# Altium footprint library PartsDatabaseV16.1.PcbLib: 145 footprints (part 2 of 10)
Each footprint in its own frame and in the unit in brackets; x right, y up, seen from the top. Pads: shape width x height; smd on the part's side, far side on the other; paste and mask are expansions set on the pad; w line width, h text height; cw(c..) or ccw(c..) is an arc to the next point about the centre after c.
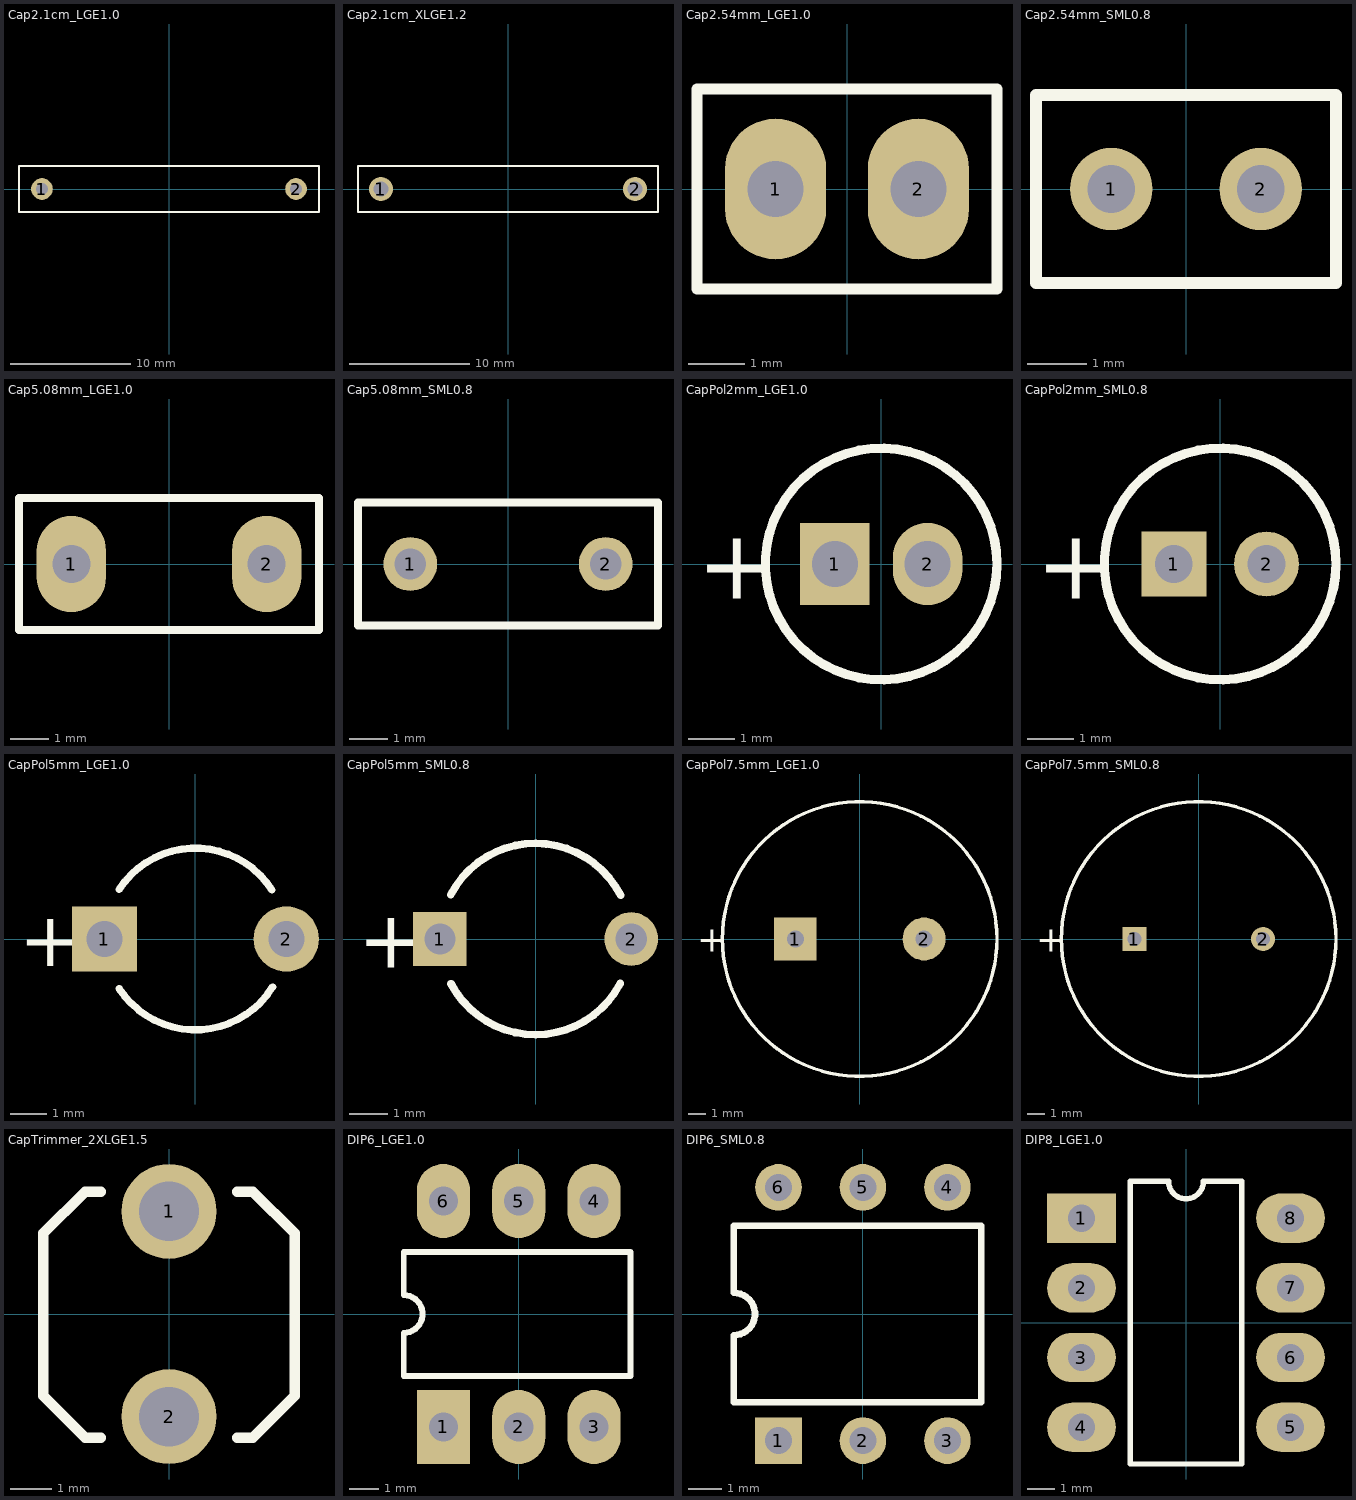
[diagram p1: the footprints below, top view; thin cyan lines are the x and y axes]

## Cap2.1cm_LGE1.0 [mm] "Radial Cap, Thru-Hole; 2 Leads"
height 6
pads (2):
  round 1.8 hole 0.991: 1(-10.541,0) 2(10.541,0)
Top Overlay:
  lines w0.2: -12.446,-1.905 -12.446,1.905 12.446,1.905 12.446,-1.905 -12.446,-1.905

## Cap2.1cm_XLGE1.2 [mm] "Radial Cap, Thru-Hole; 2 Leads"
height 6
pads (2):
  round 2 hole 1.245: 1(-10.541,0) 2(10.541,0)
Top Overlay:
  lines w0.2: -12.446,-1.905 12.446,-1.905 12.446,1.905 -12.446,1.905 -12.446,-1.905

## Cap2.54mm_LGE1.0 [mm] "Capacitor, Ceramic, Thru-Hole, Dipped Radial; Body 5.1 x 3.2 mm (WxT) Pin Spacing 2.54 mm (typ)"
height 6
pads (2):
  oval 1.8x2.5 hole 0.991: 1(-1.27,0) 2(1.27,0)
Top Overlay:
  lines w0.2: -2.667,-1.778 -2.667,1.778 2.667,1.778 2.667,-1.778 -2.667,-1.778

## Cap2.54mm_SML0.8 [mm] "Capacitor, Ceramic, Thru-Hole, Dipped Radial; Body 5.1 x 3.2 mm (WxT) Pin Spacing 2.54 mm (typ)"
height 6
pads (2):
  round 1.4 hole 0.813: 1(-1.27,0) 2(1.27,0)
Top Overlay:
  lines w0.2: -2.55,-1.6 -2.55,1.6 2.55,1.6 2.55,-1.6 -2.55,-1.6

## Cap5.08mm_LGE1.0 [mm] "Capacitor, Ceramic, Thru-Hole, Dipped Radial; Body 7.8 x 3.2 mm (WxT) Pin Spacing 5.08 mm (typ)"
height 6
pads (2):
  oval 1.8x2.5 hole 0.991: 1(-2.54,0) 2(2.54,0)
Top Overlay:
  lines w0.2: -3.9,-1.714 3.9,-1.714 3.9,1.714 -3.9,1.714 -3.9,-1.714

## Cap5.08mm_SML0.8 [mm] "Capacitor, Ceramic, Thru-Hole, Dipped Radial; Body 7.8 x 3.2 mm (WxT) Pin Spacing 5.08 mm (typ)"
height 6
pads (2):
  round 1.4 hole 0.813: 1(-2.54,0) 2(2.54,0)
Top Overlay:
  lines w0.2: -3.9,-1.6 3.9,-1.6 3.9,1.6 -3.9,1.6 -3.9,-1.6

## CapPol2mm_LGE1.0 [mm] "Capacitor, Electrolytic, Radial; Body 5 x 6.8 mm (Dia.xH typ); Pin Spacing 2 mm (typ)"
pads (2):
  rect 1.5x1.778 hole 0.991: 1(-1,0)
  oval 1.5x1.778 hole 0.991: 2(1,0)
Top Overlay:
  circle w0.2: c0,0 r2.5
  text "+" at -3.975,-0.75 h1.5

## CapPol2mm_SML0.8 [mm] "Capacitor, Electrolytic, Radial; Body 5 x 6.8 mm (Dia.xH typ); Pin Spacing 2 mm (typ)"
pads (2):
  rect 1.4x1.4 hole 0.813: 1(-1,0)
  round 1.4 hole 0.813: 2(1,0)
Top Overlay:
  circle w0.2: c0,0 r2.5
  text "+" at -3.975,-0.75 h1.5

## CapPol5mm_LGE1.0 [mm] "Capacitor, Electrolytic, Radial; Body 5 x 5 mm (Dia.xH typ); Pin Spacing 5 mm (typ)"
pads (2):
  rect 1.8x1.8 hole 0.991: 1(-2.5,0)
  round 1.8 hole 0.991: 2(2.5,0)
Top Overlay:
  lines w0.2: -2.098,1.36 cw(c0,0) 2.107,1.345 ; -2.095,-1.364 ccw(c0,0) 2.124,-1.318
  text "+" at -4.851,-0.749 h1.5

## CapPol5mm_SML0.8 [mm] "Capacitor, Electrolytic, Radial; Body 5 x 5 mm (Dia.xH typ); Pin Spacing 5 mm (typ)"
pads (2):
  rect 1.4x1.4 hole 0.813: 1(-2.5,0)
  round 1.4 hole 0.813: 2(2.5,0)
Top Overlay:
  lines w0.2: -2.215,1.159 cw(c0,0) 2.223,1.143 ; -2.21,-1.169 ccw(c0,0) 2.213,-1.163
  text "+" at -4.639,-0.75 h1.5

## CapPol7.5mm_LGE1.0 [mm] "Capacitor, Electrolytic, Radial; Body 16 x 35 mm (Dia.xH typ); Pin Spacing 7.5 mm (typ)"
pads (2):
  rect 2.5x2.5 hole 0.991: 1(-3.75,0)
  round 2.5 hole 0.991: 2(3.75,0)
Top Overlay:
  circle w0.2: c0,0 r8
  text "+" at -9.475,-0.75 h1.5

## CapPol7.5mm_SML0.8 [mm] "Capacitor, Electrolytic, Radial; Body 16 x 35 mm (Dia.xH typ); Pin Spacing 7.5 mm (typ)"
pads (2):
  rect 1.4x1.4 hole 0.813: 1(-3.75,0)
  round 1.4 hole 0.813: 2(3.75,0)
Top Overlay:
  circle w0.2: c0,0 r8
  text "+" at -9.475,-0.75 h1.5

## CapTrimmer_2XLGE1.5 [mm] "Thru-Hole(1.3mm); 2 Leads; Distance 5mm"
pads (2):
  round 2.3 hole 1.448: 1(0,2.489) 2(0,-2.489)
Top Overlay:
  lines w0.254: -1.651,-2.997 -2.032,-2.997 -3.048,-1.981 -3.048,1.956 -2.032,2.972 -1.651,2.972 ; 1.651,-2.997 2.032,-2.997 3.048,-1.981 3.048,1.956 2.032,2.972 1.651,2.972

## DIP6_LGE1.0 [mm] "DIP; 8 Leads; Row Spacing 7.62 mm; Pitch 2.54 mm"
height 5.33
pads (6):
  rect 1.8x2.5 hole 0.991: 1(-2.54,-3.81)
  oval 1.8x2.5 hole 0.991: 2(0,-3.81) 3(2.54,-3.81) 4(2.54,3.81) 5(0,3.81) 6(-2.54,3.81)
Top Overlay:
  lines w0.2: -3.88,-2.095 -3.88,-0.635 ccw(c-3.88,0) -3.88,0.635 -3.88,2.095 3.772,2.095 3.772,-2.095 -3.88,-2.095
3D body "DIP6.STEP": height 4.5, standoff -2.8, extent -3.556,-4.064 3.564,3.806

## DIP6_SML0.8 [mm] "DIP; 8 Leads; Row Spacing 7.62 mm; Pitch 2.54 mm"
height 5.33
pads (6):
  rect 1.4x1.4 hole 0.813: 1(-2.54,-3.81)
  round 1.4 hole 0.813: 2(0,-3.81) 3(2.54,-3.81) 4(2.54,3.81) 5(0,3.81) 6(-2.54,3.81)
Top Overlay:
  lines w0.2: -3.88,-2.65 3.556,-2.65 3.556,2.65 -3.88,2.65 -3.88,0.635 cw(c-3.88,0) -3.88,-0.635 -3.88,-2.65
3D body "DIP6.STEP": height 4.4, standoff -2.9, extent -3.594,-3.975 3.526,3.895

## DIP8_LGE1.0 [mm] "DIP, 8-Leads, Row Spacing 7.62mm, Pitch 2.54mm, Body 9.91x6.35mm"
height 5.34
pads (8):
  rect 2.5x1.8 hole 0.991: 1(-3.81,3.81)
  oval 2.5x1.8 hole 0.991: 2(-3.81,1.27) 3(-3.81,-1.27) 4(-3.81,-3.81) 5(3.81,-3.81) 6(3.81,-1.27) 7(3.81,1.27) 8(3.81,3.81)
Top Overlay:
  lines w0.2: -2.032,-5.15 -2.032,5.15 -0.635,5.15 ccw(c0,5.15) 0.635,5.15 2.032,5.15 2.032,-5.15 -2.032,-5.15
3D body "DIP8.step": height 4.19, standoff -2.67, extent -3.937,-5.842 3.937,5.588